# Altium footprint library 电阻封装库.PcbLib: 218 footprints (part 14 of 14)
Each footprint in its own frame and in the unit in brackets; x right, y up, seen from the top. Pads: shape width x height; smd on the part's side, far side on the other; paste and mask are expansions set on the pad; w line width, h text height; cw(c..) or ccw(c..) is an arc to the next point about the centre after c.
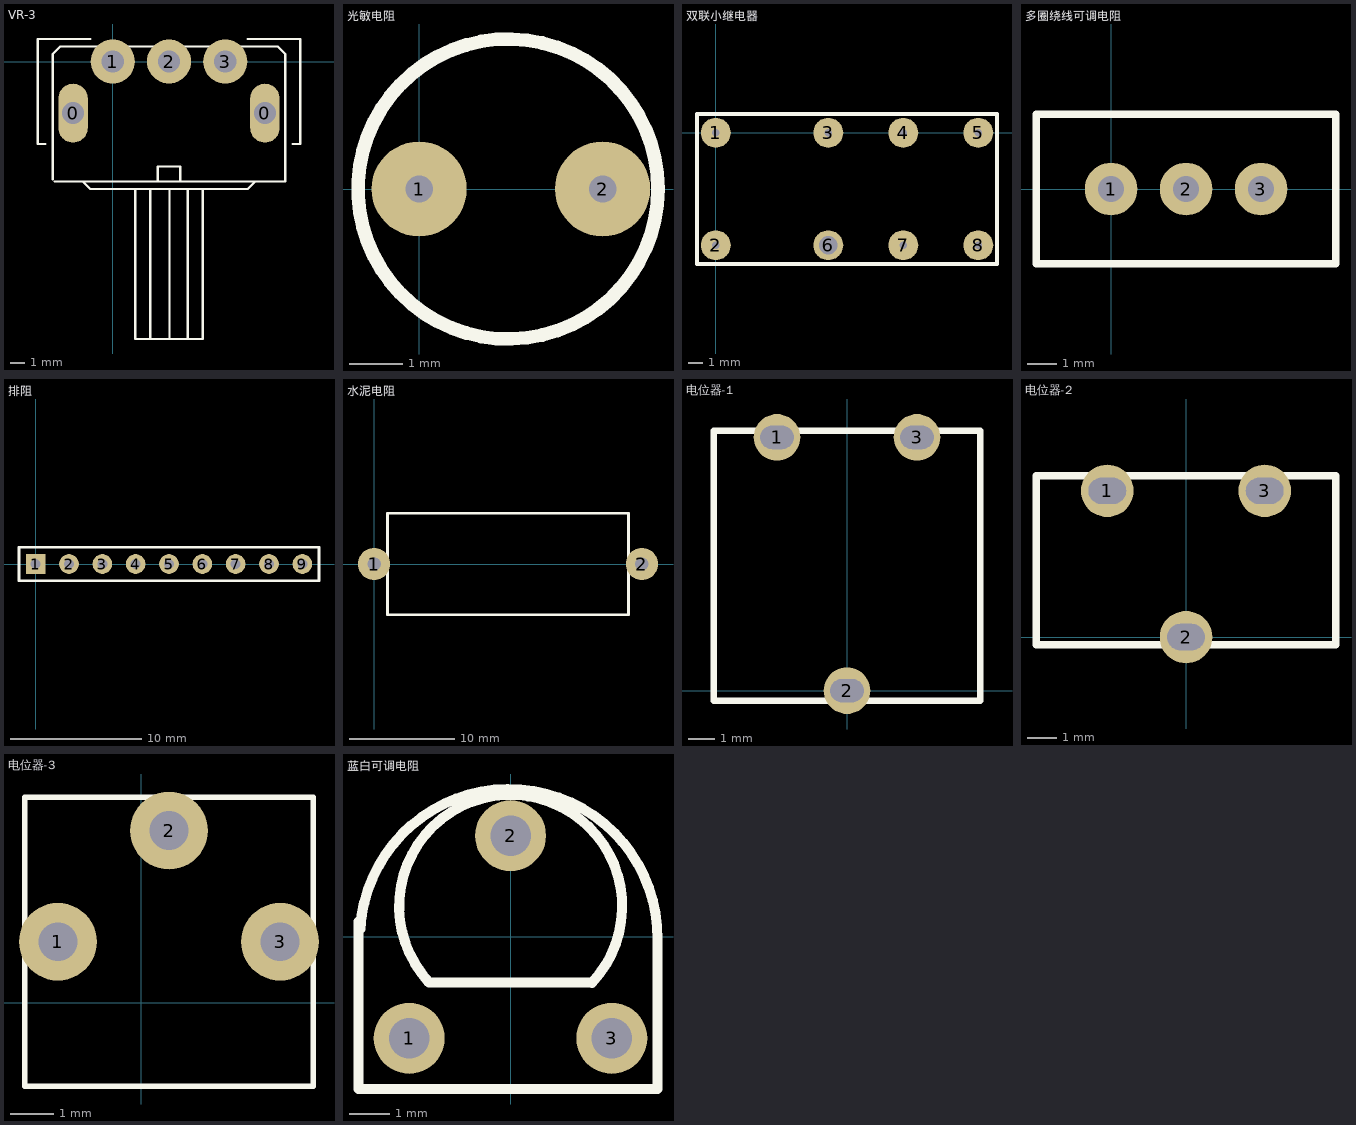
[diagram p13: the footprints below, top view; thin cyan lines are the x and y axes]

## VR-3 [mm]
pads (5):
  oval 2x4 hole 1.5: 0(-2.69,-3.5) 0(10.31,-3.5)
  round 3 hole 1.5: 1(0,0) 2(3.81,0) 3(7.62,0)
Top Overlay:
  lines w0.15: -4.572,-5.588 -5.08,-5.588 -5.08,1.524 -2.54,1.524 ; -4.572,1.524 -1.524,1.524 ; -4.064,-8 -4.064,0.508 -3.556,1.016 11.176,1.016 11.684,0.508 11.684,-8.128 -3.936,-8.128 ; -2.032,-8.128 -1.524,-8.636 9.144,-8.636 9.652,-8.128 ; 1.524,-8.636 1.524,-18.796 6.096,-18.796 6.096,-8.636 ; 2.54,-18.796 2.54,-8.636 ; 3.048,-8.128 3.048,-7.112 4.572,-7.112 4.572,-8.128 ; 3.85,-18.796 3.85,-8.636 ; 5.08,-18.796 5.08,-8.636 ; 9.144,1.524 12.7,1.524 12.7,-5.588 12.192,-5.588
Keep-Out Layer:
  lines w0.15: -2.692,-4.521 -2.692,-2.489 ; 10.308,-4.521 10.308,-2.489
3D body "User Library-Encoder.step": height 30, standoff -5, extent -6.29,-16.653 11.71,4.347

## 光敏电阻 [mil]
pads (2):
  round 70 hole 20: 1(0,0) 2(135,0)
Top Overlay:
  circle w10: c65.36,0 r110.36
3D body "User Library-KE-10715.step": height 212.99, standoff -102.36, extent -33.39,-84.64 167.4,84.65

## 双联小继电器 [mil]
pads (8):
  round 80 hole 20: 1(0,0) 2(0,-300) 3(300,0) 4(500,0) 5(700,0) 7(500,-300) 8(700,-300)
  round 80 hole 50: 6(300,-300)
Top Overlay:
  lines w10: -50,-350 -50,50 750,50 750,-350 -50,-350
3D body "双联继电器.step": height 449.32, standoff -90.55, extent -46.64,-346 748.64,47.7

## 多圈绕线可调电阻 [mil]
pads (3):
  round 70 hole 35: 1(0,0) 2(100,0) 3(200,0)
Top Overlay:
  lines w10: -100,-100 -100,100 300,100 300,-100 -100,-100
3D body "电位器-5.step": height 474.45, standoff -166.1, extent -92.9,-97.43 292.92,97.45

## 排阻 [mm]
pads (9):
  rect 1.5x1.5 hole 0.762: 1(0,0)
  round 1.5 hole 0.762: 2(2.54,0) 3(5.08,0) 4(7.62,0) 5(10.16,0) 6(12.7,0) 7(15.24,0) 8(17.78,0) 9(20.32,0)
Top Overlay:
  lines w0.2: -1.27,-1.27 -1.27,1.27 21.59,1.27 21.59,-1.27 -1.27,-1.27
3D body "User Library-R_4609X-101.STEP": height 5.11, standoff -1.48, extent -1.219,-1.215 21.581,1.265

## 水泥电阻 [mil]
pads (2):
  round 120 hole 50: 1(0,0) 2(1000,0)
Top Overlay:
  lines w10: 50,-190 50,190 950,190 950,-190 50,-190
3D body "水泥电阻5W.step": height 362.6, standoff -98.43, extent -19.68,-190.93 1019.69,190.95

## 电位器-1 [mil]
pads (3):
  round 70 hole 35 slot 50 at 0 deg: 1(-105,380) 2(0,0) 3(105,380)
Top Overlay:
  lines w10: -200,-15 -200,390 200,390 200,-15 -200,-15
3D body "SW3dPS-Trimpot Horizontal.STEP": height 305.35, standoff -80.47, extent -197.62,-13.15 196.08,388.42

## 电位器-2 [mil]
pads (3):
  round 70 hole 35 slot 50 at 0 deg: 1(-105,195) 2(0,0) 3(105,195)
Top Overlay:
  lines w10: -200,-10 200,-10 200,215 -200,215 -200,-10
3D body "SW3dPS-Trimpot Vertical.STEP": height 458.15, standoff -144.21, extent -196.85,-7.44 196.85,215

## 电位器-3 [mil]
pads (3):
  round 70 hole 35: 1(-75,55) 2(25,155) 3(125,55)
Top Overlay:
  lines w5: -105,-75 -105,185 155,185 155,-75 -105,-75
3D body "SW3dPS-3362P-1-102LF.STEP": height 188.03, standoff -103.11, extent -104.92,-74.84 154.92,185

## 蓝白可调电阻 [mil]
pads (3):
  round 70 hole 40: 1(-100,-100) 2(0,100) 3(100,-100)
Top Overlay:
  lines w10: -150,15 -150,-150 145,-150 145,-0.77 ; -148.19,8.1 cw(c-1.73,-0.77) 144.99,-2.37 ; 79.92,-44.91 -80.25,-44.91 cw(c0.11,30.2) 80.21,-45.2
3D body "PA0630NOXOX-HA1.STEP": height 295.28, standoff -78.74, extent -122.98,-150.6 128.99,124.99